# Altium footprint library iv_footprints.PcbLib: 724 footprints (part 8 of 46)
Each footprint in its own frame and in the unit in brackets; x right, y up, seen from the top. Pads: shape width x height; smd on the part's side, far side on the other; paste and mask are expansions set on the pad; w line width, h text height; cw(c..) or ccw(c..) is an arc to the next point about the centre after c.
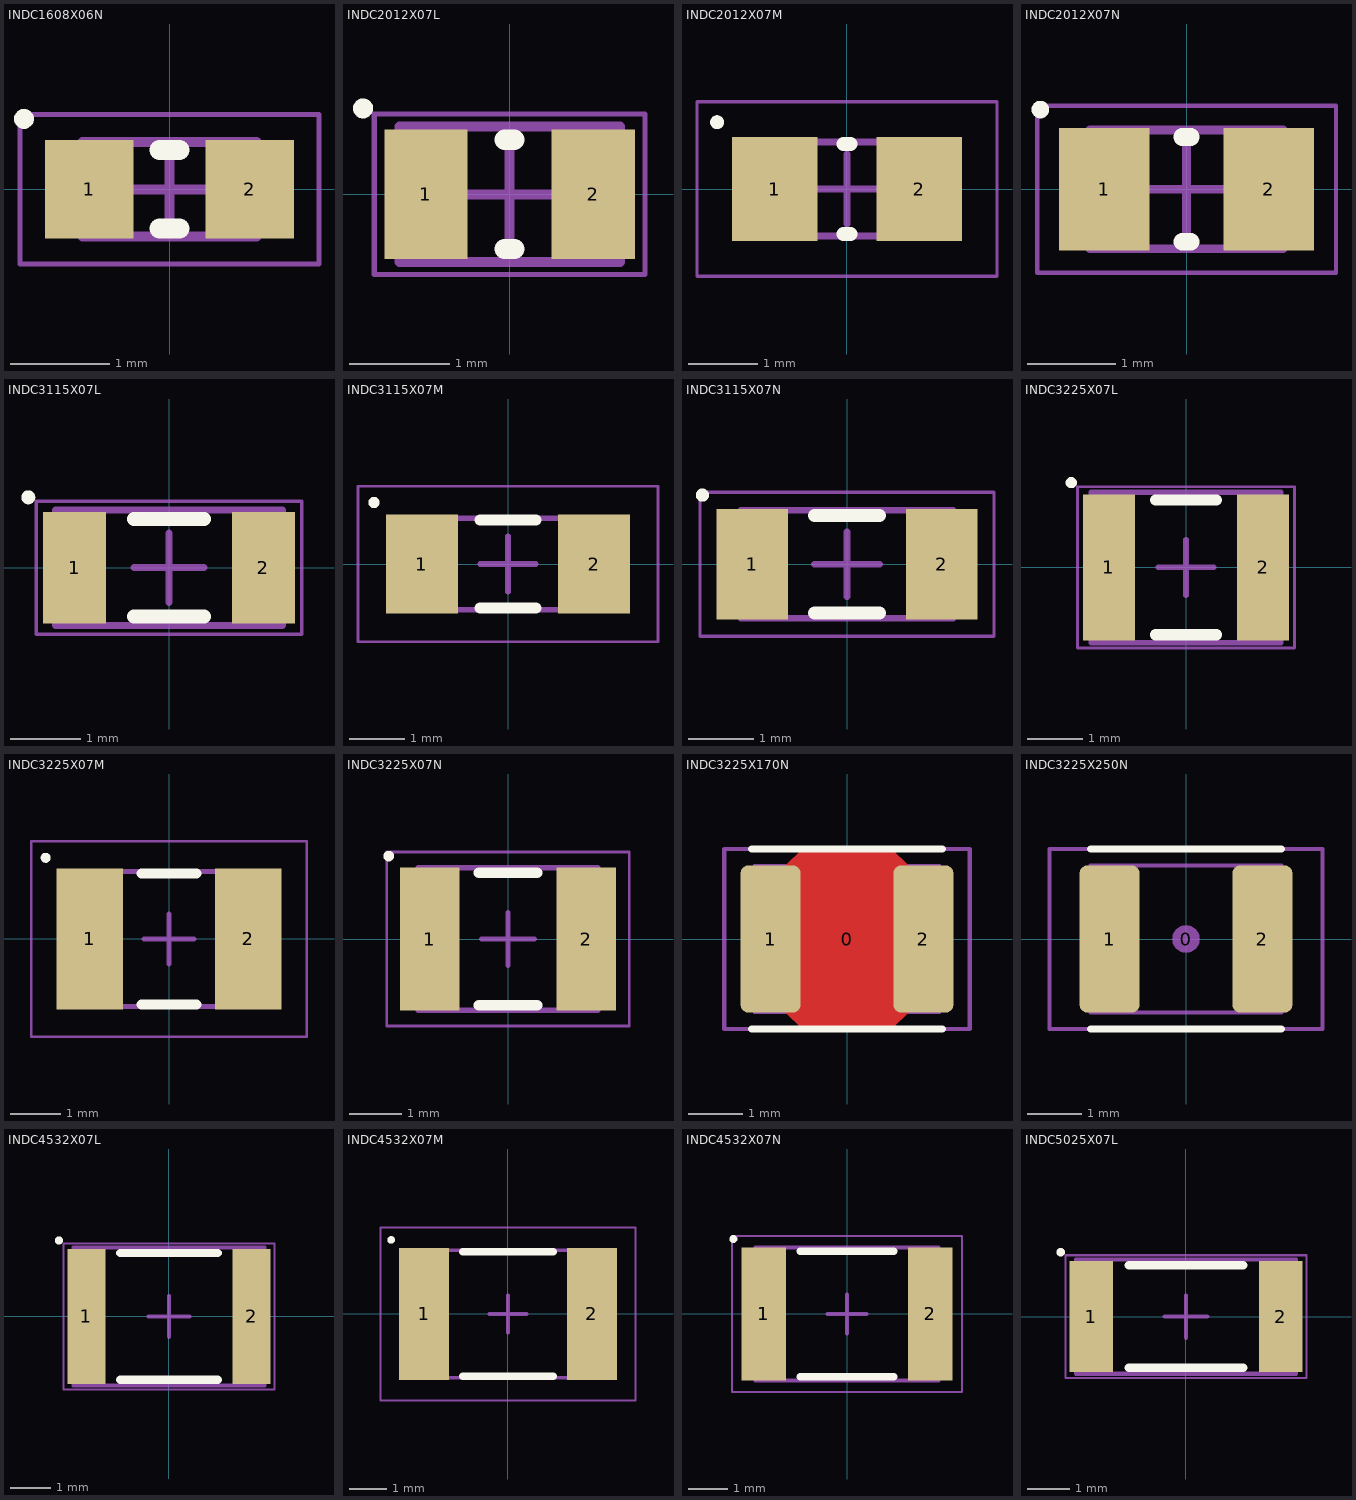
[diagram p7: the footprints below, top view; thin cyan lines are the x and y axes]

## INDC1608X06N [mm] "Chip Inductor, 2-Leads, Body 1,60x0,85mm, IPC Medium Density"
height 0.55
pads (2):
  rect 0.89x0.99 smd: 1(-0.805,0) 2(0.805,0)
Top Overlay:
  circle w0.1: c-1.462,0.707 r0.05
  lines w0.2: -0.1,-0.395 0.1,-0.395 ; -0.1,0.395 0.1,0.395
Mechanical 13:
  lines w0.1: -0.875,-0.475 0.875,-0.475 0.875,0.475 -0.875,0.475 -0.875,-0.475
Mechanical 15:
  lines w0.05: -1.5,-0.75 1.5,-0.75 1.5,0.75 -1.5,0.75 -1.5,-0.75
  lines w0.1: -0.475,0 0.475,0 ; 0,-0.475 0,0.475
3D body: height 0.55, standoff 0, extent 0.575,-0.475 0.875,0.475
3D body: height 0.55, standoff 0, extent -0.875,-0.475 -0.575,0.475
3D body: height 0.55, standoff 0, extent -0.575,-0.475 0.575,0.475

## INDC2012X07L [mm] "Chip Inductor, 2-Leads, Body 2,00x1,25mm, IPC High Density"
height 0.7
pads (2):
  rect 0.83x1.29 smd: 1(-0.835,0) 2(0.835,0)
Top Overlay:
  circle w0.1: c-1.462,0.857 r0.05
  lines w0.2: -0.05,-0.545 0.05,-0.545 ; -0.05,0.545 0.05,0.545
Mechanical 13:
  lines w0.1: -1.1,-0.675 1.1,-0.675 1.1,0.675 -1.1,0.675 -1.1,-0.675
Mechanical 15:
  lines w0.05: -1.35,-0.8 1.35,-0.8 1.35,0.8 -1.35,0.8 -1.35,-0.8
  lines w0.1: -0.5,0 0.5,0 ; 0,-0.5 0,0.5
3D body: height 0.7, standoff 0, extent 0.7,-0.675 1.1,0.675
3D body: height 0.7, standoff 0, extent -1.1,-0.675 -0.7,0.675
3D body: height 0.7, standoff 0, extent -0.7,-0.675 0.7,0.675

## INDC2012X07M [mm] "Chip Inductor, 2-Leads, Body 2,00x1,25mm, IPC Low Density"
height 0.7
pads (2):
  rect 1.23x1.49 smd: 1(-1.035,0) 2(1.035,0)
Top Overlay:
  circle w0.1: c-1.862,0.957 r0.05
  lines w0.2: -0.05,-0.645 0.05,-0.645 ; -0.05,0.645 0.05,0.645
Mechanical 13:
  lines w0.1: -1.1,-0.675 1.1,-0.675 1.1,0.675 -1.1,0.675 -1.1,-0.675
Mechanical 15:
  lines w0.05: -2.15,-1.25 2.15,-1.25 2.15,1.25 -2.15,1.25 -2.15,-1.25
  lines w0.1: -0.5,0 0.5,0 ; 0,-0.5 0,0.5
3D body: height 0.7, standoff 0, extent 0.7,-0.675 1.1,0.675
3D body: height 0.7, standoff 0, extent -1.1,-0.675 -0.7,0.675
3D body: height 0.7, standoff 0, extent -0.7,-0.675 0.7,0.675

## INDC2012X07N [mm] "Chip Inductor, 2-Leads, Body 2,00x1,25mm, IPC Medium Density"
height 0.7
pads (2):
  rect 1.03x1.39 smd: 1(-0.935,0) 2(0.935,0)
Top Overlay:
  circle w0.1: c-1.662,0.907 r0.05
  lines w0.2: -0.05,-0.595 0.05,-0.595 ; -0.05,0.595 0.05,0.595
Mechanical 13:
  lines w0.1: -1.1,-0.675 1.1,-0.675 1.1,0.675 -1.1,0.675 -1.1,-0.675
Mechanical 15:
  lines w0.05: -1.7,-0.95 1.7,-0.95 1.7,0.95 -1.7,0.95 -1.7,-0.95
  lines w0.1: -0.5,0 0.5,0 ; 0,-0.5 0,0.5
3D body: height 0.7, standoff 0, extent 0.7,-0.675 1.1,0.675
3D body: height 0.7, standoff 0, extent -1.1,-0.675 -0.7,0.675
3D body: height 0.7, standoff 0, extent -0.7,-0.675 0.7,0.675

## INDC3115X07L [mm] "Chip Inductor, 2-Leads, Body 3,13x1,55mm, IPC High Density"
height 0.7
pads (2):
  rect 0.9x1.59 smd: 1(-1.35,0) 2(1.35,0)
Top Overlay:
  circle w0.1: c-2.012,1.007 r0.05
  lines w0.2: -0.5,-0.695 0.5,-0.695 ; -0.5,0.695 0.5,0.695
Mechanical 13:
  lines w0.1: -1.625,-0.825 1.625,-0.825 1.625,0.825 -1.625,0.825 -1.625,-0.825
Mechanical 15:
  lines w0.05: -1.9,-0.95 1.9,-0.95 1.9,0.95 -1.9,0.95 -1.9,-0.95
  lines w0.1: -0.5,0 0.5,0 ; 0,-0.5 0,0.5
3D body: height 0.7, standoff 0, extent 1.125,-0.825 1.625,0.825
3D body: height 0.7, standoff 0, extent -1.625,-0.825 -1.125,0.825
3D body: height 0.7, standoff 0, extent -1.125,-0.825 1.125,0.825

## INDC3115X07M [mm] "Chip Inductor, 2-Leads, Body 3,13x1,55mm, IPC Low Density"
height 0.7
pads (2):
  rect 1.3x1.79 smd: 1(-1.55,0) 2(1.55,0)
Top Overlay:
  circle w0.1: c-2.412,1.107 r0.05
  lines w0.2: -0.5,-0.795 0.5,-0.795 ; -0.5,0.795 0.5,0.795
Mechanical 13:
  lines w0.1: -1.625,-0.825 1.625,-0.825 1.625,0.825 -1.625,0.825 -1.625,-0.825
Mechanical 15:
  lines w0.05: -2.7,-1.4 2.7,-1.4 2.7,1.4 -2.7,1.4 -2.7,-1.4
  lines w0.1: -0.5,0 0.5,0 ; 0,-0.5 0,0.5
3D body: height 0.7, standoff 0, extent 1.125,-0.825 1.625,0.825
3D body: height 0.7, standoff 0, extent -1.625,-0.825 -1.125,0.825
3D body: height 0.7, standoff 0, extent -1.125,-0.825 1.125,0.825

## INDC3115X07N [mm] "Chip Inductor, 2-Leads, Body 3,13x1,55mm, IPC Medium Density"
height 0.7
pads (2):
  rect 1.1x1.69 smd: 1(-1.45,0) 2(1.45,0)
Top Overlay:
  circle w0.1: c-2.212,1.057 r0.05
  lines w0.2: -0.5,-0.745 0.5,-0.745 ; -0.5,0.745 0.5,0.745
Mechanical 13:
  lines w0.1: -1.625,-0.825 1.625,-0.825 1.625,0.825 -1.625,0.825 -1.625,-0.825
Mechanical 15:
  lines w0.05: -2.25,-1.1 2.25,-1.1 2.25,1.1 -2.25,1.1 -2.25,-1.1
  lines w0.1: -0.5,0 0.5,0 ; 0,-0.5 0,0.5
3D body: height 0.7, standoff 0, extent 1.125,-0.825 1.625,0.825
3D body: height 0.7, standoff 0, extent -1.625,-0.825 -1.125,0.825
3D body: height 0.7, standoff 0, extent -1.125,-0.825 1.125,0.825

## INDC3225X07L [mm] "Chip Inductor, 2-Leads, Body 3,20x2,50mm, IPC High Density"
height 0.7
pads (2):
  rect 0.93x2.62 smd: 1(-1.385,0) 2(1.385,0)
Top Overlay:
  circle w0.1: c-2.062,1.522 r0.05
  lines w0.2: -0.55,-1.21 0.55,-1.21 ; -0.55,1.21 0.55,1.21
Mechanical 13:
  lines w0.1: -1.7,-1.35 1.7,-1.35 1.7,1.35 -1.7,1.35 -1.7,-1.35
Mechanical 15:
  lines w0.05: -1.95,-1.45 1.95,-1.45 1.95,1.45 -1.95,1.45 -1.95,-1.45
  lines w0.1: -0.5,0 0.5,0 ; 0,-0.5 0,0.5
3D body: height 0.7, standoff 0, extent 1.2,-1.35 1.7,1.35
3D body: height 0.7, standoff 0, extent -1.7,-1.35 -1.2,1.35
3D body: height 0.7, standoff 0, extent -1.2,-1.35 1.2,1.35

## INDC3225X07M [mm] "Chip Inductor, 2-Leads, Body 3,20x2,50mm, IPC Low Density"
height 0.7
pads (2):
  rect 1.33x2.82 smd: 1(-1.585,0) 2(1.585,0)
Top Overlay:
  circle w0.1: c-2.462,1.622 r0.05
  lines w0.2: -0.55,-1.31 0.55,-1.31 ; -0.55,1.31 0.55,1.31
Mechanical 13:
  lines w0.1: -1.7,-1.35 1.7,-1.35 1.7,1.35 -1.7,1.35 -1.7,-1.35
Mechanical 15:
  lines w0.05: -2.75,-1.95 2.75,-1.95 2.75,1.95 -2.75,1.95 -2.75,-1.95
  lines w0.1: -0.5,0 0.5,0 ; 0,-0.5 0,0.5
3D body: height 0.7, standoff 0, extent 1.2,-1.35 1.7,1.35
3D body: height 0.7, standoff 0, extent -1.7,-1.35 -1.2,1.35
3D body: height 0.7, standoff 0, extent -1.2,-1.35 1.2,1.35

## INDC3225X07N [mm] "Chip Inductor, 2-Leads, Body 3,20x2,50mm, IPC Medium Density"
height 0.7
pads (2):
  rect 1.13x2.72 smd: 1(-1.485,0) 2(1.485,0)
Top Overlay:
  circle w0.1: c-2.262,1.572 r0.05
  lines w0.2: -0.55,-1.26 0.55,-1.26 ; -0.55,1.26 0.55,1.26
Mechanical 13:
  lines w0.1: -1.7,-1.35 1.7,-1.35 1.7,1.35 -1.7,1.35 -1.7,-1.35
Mechanical 15:
  lines w0.05: -2.3,-1.65 2.3,-1.65 2.3,1.65 -2.3,1.65 -2.3,-1.65
  lines w0.1: -0.5,0 0.5,0 ; 0,-0.5 0,0.5
3D body: height 0.7, standoff 0, extent 1.2,-1.35 1.7,1.35
3D body: height 0.7, standoff 0, extent -1.7,-1.35 -1.2,1.35
3D body: height 0.7, standoff 0, extent -1.2,-1.35 1.2,1.35

## INDC3225X170N [mm] "Chip Inductor, 2-Leads, Body 3.2x2.5mm, IPC Medium Density"
height 1.7
pads (3):
  round 0.508 on Mech15: 0(0,0)
  rrect25% 1.1x2.7 smd: 1(-1.4,0) 2(1.4,0)
Top Layer:
  pour cut-out: -1.125,1.35 -0.825,1.65 0.825,1.65 1.125,1.35 1.125,-1.35 0.825,-1.65 -0.825,-1.65 -1.125,-1.35
Top Overlay:
  lines w0.127: -1.75,-1.651 1.75,-1.651 ; -1.75,1.651 1.75,1.651
Mechanical 13:
  lines w0.05: -1.7,-1.35 -1.7,1.35 1.7,1.35 1.7,-1.35 -1.7,-1.35
Mechanical 15:
  lines w0.076: -2.25,-1.65 2.25,-1.65 2.25,1.65 -2.25,1.65 -2.25,-1.65
3D body "INDC3225X170N.STEP": height 1.7, standoff 0, extent -1.71,-1.36 1.71,1.36

## INDC3225X250N [mm] "Chip Inductor, 2-Leads, Body 3.2x2.5mm, IPC Medium Density"
height 2.7
pads (3):
  round 0.508 on Mech15: 0(0,0)
  rrect25% 1.1x2.7 smd: 1(-1.4,0) 2(1.4,0)
Top Overlay:
  lines w0.127: -1.75,-1.651 1.75,-1.651 ; -1.75,1.651 1.75,1.651
Mechanical 13:
  lines w0.076: -1.75,-1.35 1.75,-1.35 1.75,1.35 -1.75,1.35 -1.75,-1.35
Mechanical 15:
  lines w0.076: -2.5,-1.65 2.5,-1.65 2.5,1.65 -2.5,1.65 -2.5,-1.65
3D body "INDC3225X250N.STEP": height 2.7, standoff 0, extent -1.7,-1.35 1.7,1.35

## INDC4532X07L [mm] "Chip Inductor, 2-Leads, Body 4,50x3,20mm, IPC High Density"
height 0.7
pads (2):
  rect 0.93x3.32 smd: 1(-2.035,0) 2(2.035,0)
Top Overlay:
  circle w0.1: c-2.712,1.872 r0.05
  lines w0.2: -1.2,-1.56 1.2,-1.56 ; -1.2,1.56 1.2,1.56
Mechanical 13:
  lines w0.1: -2.35,-1.7 2.35,-1.7 2.35,1.7 -2.35,1.7 -2.35,-1.7
Mechanical 15:
  lines w0.05: -2.6,-1.8 2.6,-1.8 2.6,1.8 -2.6,1.8 -2.6,-1.8
  lines w0.1: -0.5,0 0.5,0 ; 0,-0.5 0,0.5
3D body: height 0.7, standoff 0, extent 1.85,-1.7 2.35,1.7
3D body: height 0.7, standoff 0, extent -2.35,-1.7 -1.85,1.7
3D body: height 0.7, standoff 0, extent -1.85,-1.7 1.85,1.7

## INDC4532X07M [mm] "Chip Inductor, 2-Leads, Body 4,50x3,20mm, IPC Low Density"
height 0.7
pads (2):
  rect 1.33x3.52 smd: 1(-2.235,0) 2(2.235,0)
Top Overlay:
  circle w0.1: c-3.112,1.972 r0.05
  lines w0.2: -1.2,-1.66 1.2,-1.66 ; -1.2,1.66 1.2,1.66
Mechanical 13:
  lines w0.1: -2.35,-1.7 2.35,-1.7 2.35,1.7 -2.35,1.7 -2.35,-1.7
Mechanical 15:
  lines w0.05: -3.4,-2.3 3.4,-2.3 3.4,2.3 -3.4,2.3 -3.4,-2.3
  lines w0.1: -0.5,0 0.5,0 ; 0,-0.5 0,0.5
3D body: height 0.7, standoff 0, extent 1.85,-1.7 2.35,1.7
3D body: height 0.7, standoff 0, extent -2.35,-1.7 -1.85,1.7
3D body: height 0.7, standoff 0, extent -1.85,-1.7 1.85,1.7

## INDC4532X07N [mm] "Chip Inductor, 2-Leads, Body 4,50x3,20mm, IPC Medium Density"
height 0.7
pads (2):
  rect 1.13x3.42 smd: 1(-2.135,0) 2(2.135,0)
Top Overlay:
  circle w0.1: c-2.912,1.922 r0.05
  lines w0.2: -1.2,-1.61 1.2,-1.61 ; -1.2,1.61 1.2,1.61
Mechanical 13:
  lines w0.1: -2.35,-1.7 2.35,-1.7 2.35,1.7 -2.35,1.7 -2.35,-1.7
Mechanical 15:
  lines w0.05: -2.95,-2 2.95,-2 2.95,2 -2.95,2 -2.95,-2
  lines w0.1: -0.5,0 0.5,0 ; 0,-0.5 0,0.5
3D body: height 0.7, standoff 0, extent 1.85,-1.7 2.35,1.7
3D body: height 0.7, standoff 0, extent -2.35,-1.7 -1.85,1.7
3D body: height 0.7, standoff 0, extent -1.85,-1.7 1.85,1.7

## INDC5025X07L [mm] "Chip Inductor, 2-Leads, Body 5,00x2,50mm, IPC High Density"
height 0.7
pads (2):
  rect 1.03x2.62 smd: 1(-2.235,0) 2(2.235,0)
Top Overlay:
  circle w0.1: c-2.962,1.522 r0.05
  lines w0.2: -1.35,-1.21 1.35,-1.21 ; -1.35,1.21 1.35,1.21
Mechanical 13:
  lines w0.1: -2.6,-1.35 2.6,-1.35 2.6,1.35 -2.6,1.35 -2.6,-1.35
Mechanical 15:
  lines w0.05: -2.85,-1.45 2.85,-1.45 2.85,1.45 -2.85,1.45 -2.85,-1.45
  lines w0.1: -0.5,0 0.5,0 ; 0,-0.5 0,0.5
3D body: height 0.7, standoff 0, extent 2,-1.35 2.6,1.35
3D body: height 0.7, standoff 0, extent -2.6,-1.35 -2,1.35
3D body: height 0.7, standoff 0, extent -2,-1.35 2,1.35